# Altium footprint library Cty1.PcbLib: 870 footprints (part 48 of 55)
Each footprint in its own frame and in the unit in brackets; x right, y up, seen from the top. Pads: shape width x height; smd on the part's side, far side on the other; paste and mask are expansions set on the pad; w line width, h text height; cw(c..) or ccw(c..) is an arc to the next point about the centre after c.
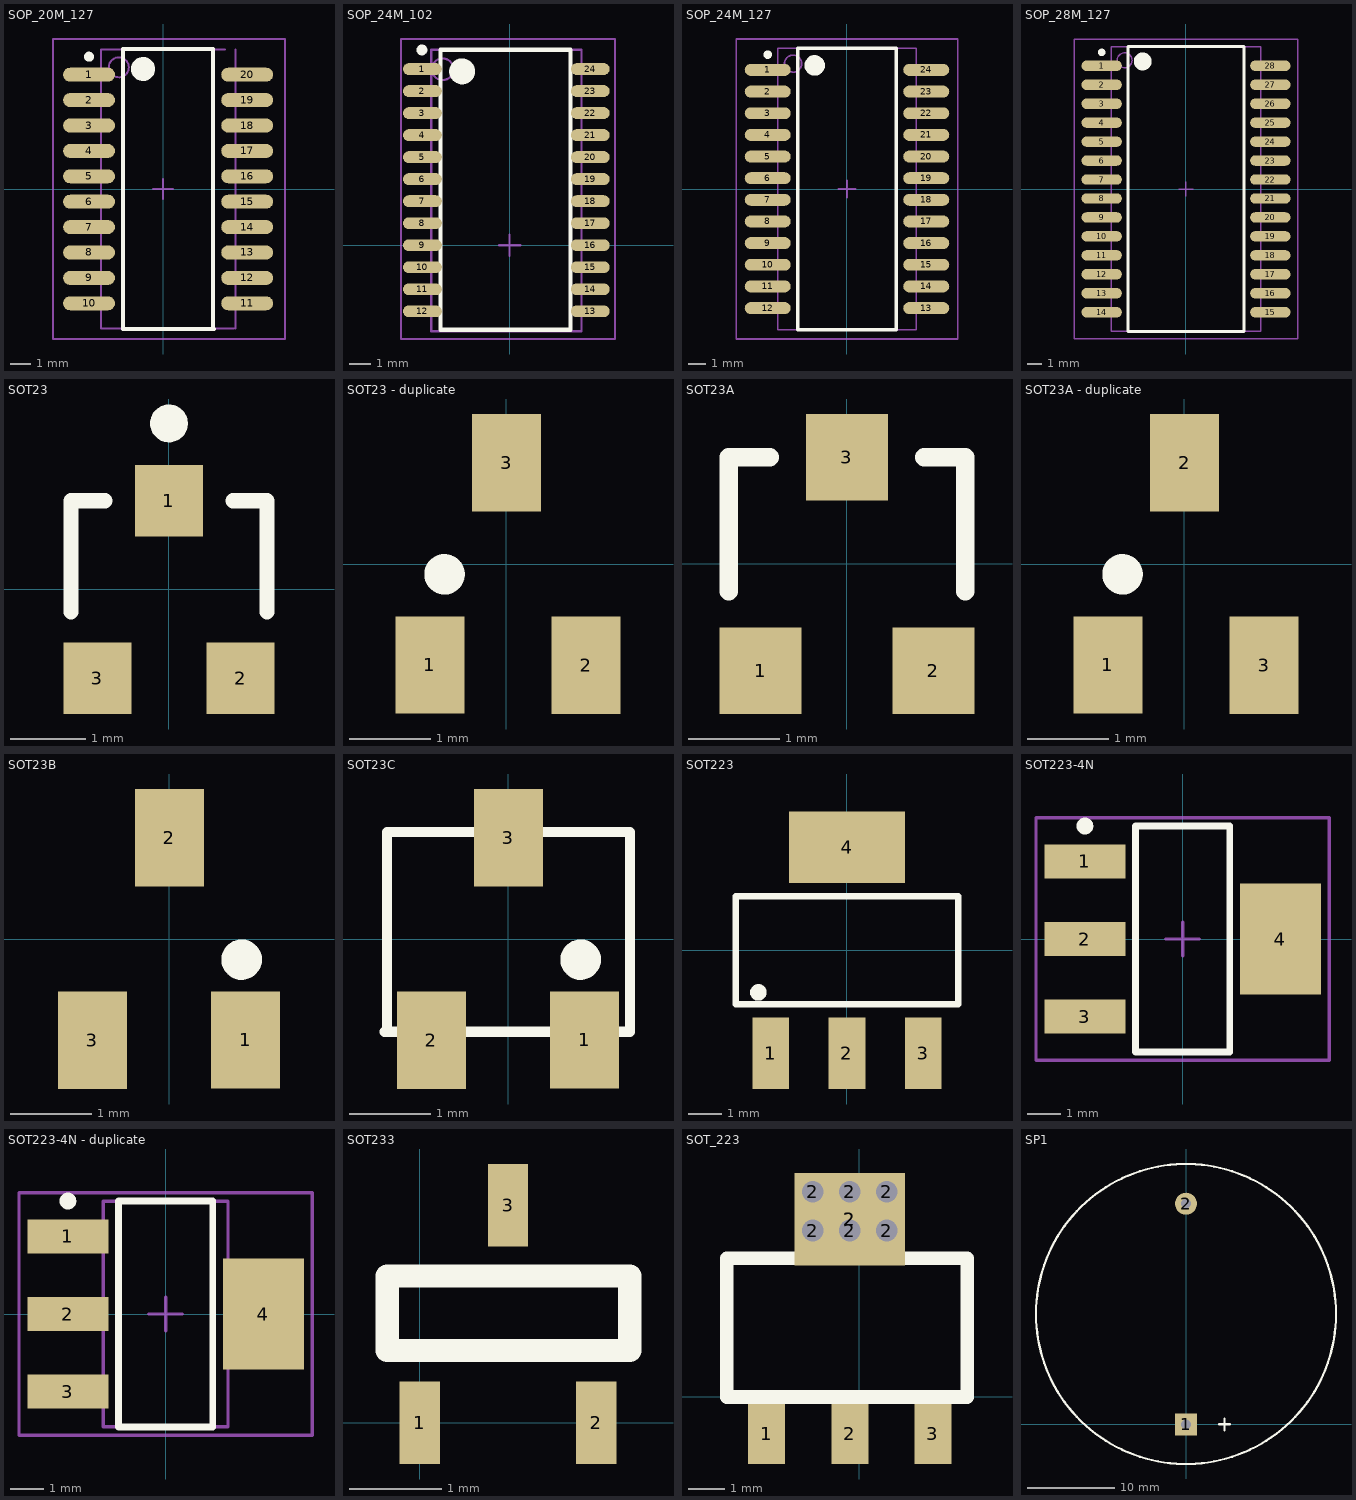
[diagram p47: the footprints below, top view; thin cyan lines are the x and y axes]

## SOP_20M_127 [mm] "SOP, 20-Leads, Body 13.4x6.2mm, Pitch 1.27mm, IPC Low Density"
height 2
pads (20):
  oval 2.6x0.7 smd: 1(-3.7,5.715) 2(-3.7,4.445) 3(-3.7,3.175) 4(-3.7,1.905) 5(-3.7,0.635) 6(-3.7,-0.635) 7(-3.7,-1.905) 8(-3.7,-3.175) 9(-3.7,-4.445) 10(-3.7,-5.715) 11(4.208,-5.715) 12(4.208,-4.445) 13(4.208,-3.175) 14(4.208,-1.905) 15(4.208,-0.635) 16(4.208,0.635) 17(4.208,1.905) 18(4.208,3.175) 19(4.208,4.445) 20(4.208,5.715)
Top Overlay:
  circle w0.6: c-1,6 r0.3
  circle w0.25: c-3.7,6.615 r0.125
  lines w0.2: 2.413,7 -2,7 -2,-7 2.54,-7 ; 2.508,-7 2.508,7
Mechanical 13:
  circle w0.1: c-2.21,6.085 r0.5
  lines w0.1: 3.11,6.985 -3.11,6.985 -3.11,-6.985 3.556,-6.985 ; 3.618,-6.985 3.618,6.985
Mechanical 15:
  lines w0.1: -0.5,0 0.5,0 ; 0,-0.5 0,0.5 ; -5.5,-7.5 6.096,-7.5 6.096,7.5 -5.5,7.5 -5.5,-7.5
3D body: height 2, standoff 0, extent -3.11,-6.985 3.556,6.985

## SOP_24M_102 [mm] "24-Pin Small Outline Package 1.02 mm Pitch"
height 2.64
pads (24):
  oval 1.8x0.55 smd: 1(-4.039,8.16) 2(-4.039,7.14) 3(-4.039,6.12) 4(-4.039,5.1) 5(-4.039,4.08) 6(-4.039,3.06) 7(-4.039,2.04) 8(-4.039,1.02) 9(-4.039,0) 10(-4.039,-1.02) 11(-4.039,-2.04) 12(-4.039,-3.06) 13(3.734,-3.06) 14(3.734,-2.04) 15(3.734,-1.02) 16(3.734,0) 17(3.734,1.02) 18(3.734,2.04) 19(3.734,3.06) 20(3.734,4.08) 21(3.734,5.1) 22(3.734,6.12) 23(3.734,7.14) 24(3.734,8.16)
Top Overlay:
  circle w0.6: c-2.2,8.05 r0.3
  circle w0.25: c-4.062,9.042 r0.125
  lines w0.2: -3.2,-3.912 2.819,-3.912 2.819,9.05 -3.2,9.05 -3.2,-3.912
Mechanical 13:
  circle w0.1: c-3.1,8.15 r0.5
  lines w0.1: -3.632,-3.988 3.327,-3.988 3.327,9.05 -3.632,9.05 -3.632,-3.988
Mechanical 15:
  lines w0.1: -0.5,0 0.5,0 ; 0,-0.5 0,0.5 ; -5.029,-4.343 4.877,-4.343 4.877,9.55 -5.029,9.55 -5.029,-4.343
3D body: height 2.64, standoff 0, extent -3.632,-3.937 3.353,9.05

## SOP_24M_127 [mm] "SOP, 24-Leads, Body 15.6x8.1mm, Pitch 1.27mm, IPC Low Density"
height 2.5
pads (24):
  oval 2.7x0.7 smd: 1(-4.65,6.985) 2(-4.65,5.715) 3(-4.65,4.445) 4(-4.65,3.175) 5(-4.65,1.905) 6(-4.65,0.635) 7(-4.65,-0.635) 8(-4.65,-1.905) 9(-4.65,-3.175) 10(-4.65,-4.445) 11(-4.65,-5.715) 12(-4.65,-6.985) 13(4.65,-6.985) 14(4.65,-5.715) 15(4.65,-4.445) 16(4.65,-3.175) 17(4.65,-1.905) 18(4.65,-0.635) 19(4.65,0.635) 20(4.65,1.905) 21(4.65,3.175) 22(4.65,4.445) 23(4.65,5.715) 24(4.65,6.985)
Top Overlay:
  circle w0.25: c-4.65,7.885 r0.125
  circle w0.6: c-1.9,7.25 r0.3
  lines w0.2: -2.9,-8.25 -2.9,8.25 2.9,8.25 2.9,-8.25 -2.9,-8.25
Mechanical 13:
  circle w0.1: c-3.165,7.355 r0.5
  lines w0.1: -4.065,-8.255 -4.065,8.255 4.065,8.255 4.065,-8.255 -4.065,-8.255
Mechanical 15:
  lines w0.1: -0.5,0 0.5,0 ; 0,-0.5 0,0.5 ; -6.5,-8.8 -6.5,8.8 6.5,8.8 6.5,-8.8 -6.5,-8.8
3D body "SW3dPS-24 pin soic.STEP": height 2.7, standoff -0.11, extent -4.949,-7.853 5.051,7.747
3D body: height 2.79, standoff 0.25, extent -2.649,6.324 -1.785,7.111
3D body: height 2.79, standoff 2.54, extent -0.533,7.188 0.61,7.696

## SOP_28M_127 [mm] "SOP, 28-Leads, Body 18.1x8.6mm, Pitch 1.27mm, IPC Low Density"
height 3.05
pads (28):
  oval 2.7x0.7 smd: 1(-5.65,8.255) 2(-5.65,6.985) 3(-5.65,5.715) 4(-5.65,4.445) 5(-5.65,3.175) 6(-5.65,1.905) 7(-5.65,0.635) 8(-5.65,-0.635) 9(-5.65,-1.905) 10(-5.65,-3.175) 11(-5.65,-4.445) 12(-5.65,-5.715) 13(-5.65,-6.985) 14(-5.65,-8.255) 15(5.65,-8.255) 16(5.65,-6.985) 17(5.65,-5.715) 18(5.65,-4.445) 19(5.65,-3.175) 20(5.65,-1.905) 21(5.65,-0.635) 22(5.65,0.635) 23(5.65,1.905) 24(5.65,3.175) 25(5.65,4.445) 26(5.65,5.715) 27(5.65,6.985) 28(5.65,8.255)
Top Overlay:
  circle w0.6: c-2.9,8.55 r0.3
  circle w0.25: c-5.65,9.155 r0.125
  lines w0.2: -3.9,-9.55 3.9,-9.55 3.9,9.55 -3.9,9.55 -3.9,-9.55
Mechanical 13:
  circle w0.1: c-4.115,8.625 r0.5
  lines w0.1: -5.015,-9.525 5.015,-9.525 5.015,9.525 -5.015,9.525 -5.015,-9.525
Mechanical 15:
  lines w0.1: -0.5,0 0.5,0 ; 0,-0.5 0,0.5 ; -7.5,-10.05 7.5,-10.05 7.5,10.05 -7.5,10.05 -7.5,-10.05
3D body "SO28.STEP": height 2.64, standoff 0, extent -5.336,-9.04 5.334,9.04

## SOT23 [mm] "SOT-23; 3 Leads; Body 3.1 x 2.5 mm, inc. leads (LxW max), Alternate Lead Configuration"
height 1.1
pads (3):
  rect 0.9x0.95 smd: 1(0,1.175) 2(0.95,-1.175) 3(-0.95,-1.175)
Top Overlay:
  circle w0.25: c0,2.2 r0.125
  lines w0.2: -1.3,-0.3 -1.3,1.175 -0.85,1.175 ; 0.85,1.175 1.3,1.175 1.3,-0.3

## SOT23 - duplicate [mm] "SOT 23 _ 1-3-2"
height 1.27
pads (3):
  rect 0.85x1.2 smd: 1(-0.94,-1.245) 2(0.985,-1.25) 3(0.005,1.25)
Top Overlay:
  circle w0.25: c-0.76,-0.127 r0.125
3D body "SW3DPS-SOT-23-DEFAULT.STEP": height 1.06, standoff -0.04, extent -1.475,-1.326 1.525,1.174

## SOT23A [mm] "SOT-23; 3 Leads; Body 3.0 x 2.5 mm, inc. leads (LxW max)"
height 1.2
pads (3):
  rect 0.9x0.95 smd: 1(-0.95,-1.175) 2(0.95,-1.175) 3(0,1.175)
Top Overlay:
  lines w0.2: -1.3,-0.3 -1.3,1.175 -0.85,1.175 ; 0.85,1.175 1.3,1.175 1.3,-0.3

## SOT23A - duplicate [mm] "SOT 23A"
height 1.27
pads (3):
  rect 0.85x1.2 smd: 1(-0.94,-1.245) 2(0.005,1.25) 3(0.985,-1.25)
Top Overlay:
  circle w0.25: c-0.76,-0.127 r0.125
3D body "SW3DPS-SOT-23-DEFAULT.STEP": height 1.06, standoff -0.04, extent -1.5,-1.301 1.5,1.199

## SOT23B [mm] "SOT 23B"
height 1.27
pads (3):
  rect 0.85x1.2 smd: 1(0.94,-1.245) 2(0,1.25) 3(-0.95,-1.25)
Top Overlay:
  circle w0.25: c0.891,-0.254 r0.125
3D body "SW3DPS-SOT-23-DEFAULT.STEP": height 1.06, standoff -0.04, extent -1.5,-1.301 1.5,1.199

## SOT23C [mm] "SOT 23C - 2-3-1 - BCE"
height 1.27
pads (3):
  rect 0.85x1.2 smd: 1(0.94,-1.245) 2(-0.95,-1.25) 3(0,1.25)
Top Overlay:
  circle w0.25: c0.891,-0.254 r0.125
  lines w0.127: -1.524,-1.143 -1.499,-1.143 -1.499,1.321 1.499,1.321 1.499,-1.143 -1.524,-1.143
3D body "SW3DPS-SOT-23-DEFAULT.STEP": height 1.06, standoff -0.04, extent -1.5,-1.174 1.5,1.326

## SOT223 [mm] "SOT-223/SC-73; 4 Leads; Body 6.7 x 7.3 mm, inc. leads (LxW max)"
height 1.8
pads (4):
  rect 1.1x2.15 smd: 1(-2.3,-3.1) 2(0,-3.1) 3(2.3,-3.1)
  rect 3.5x2.15 smd: 4(0,3.1)
Top Overlay:
  circle w0.25: c-2.665,-1.27 r0.125
  lines w0.2: -3.35,-1.625 3.35,-1.625 3.35,1.625 -3.35,1.625 -3.35,-1.625
3D body: height 2.54, standoff 0, extent -3.429,-1.651 3.429,1.651

## SOT223-4N [mm] "SOT223, 4-Leads, Body 6.5x3.5mm, Pitch 2.3mm, Lead Span 7mm, IPC Medium Density"
height 1.8
pads (4):
  rect 2.4x1 smd: 1(-2.9,2.3) 2(-2.9,0) 3(-2.9,-2.3)
  rect 2.4x3.3 smd: 4(2.9,0)
Top Overlay:
  circle w0.25: c-2.9,3.35 r0.125
  lines w0.2: -1.4,-3.35 -1.4,3.35 1.4,3.35 1.4,-3.35 -1.4,-3.35
Mechanical 15:
  lines w0.1: -0.5,0 0.5,0 ; 0,-0.5 0,0.5 ; -4.35,-3.6 -4.35,3.6 4.35,3.6 4.35,-3.6 -4.35,-3.6
3D body "SW3dPS-Regulator.STEP": height 1.72, standoff 0.02, extent -3.395,-3.274 3.496,3.226

## SOT223-4N - duplicate [mm] "SOT223, 4-Leads, Body 6.5x3.5mm, Pitch 2.3mm, Lead Span 7mm, IPC Medium Density"
height 1.8
pads (4):
  rect 2.4x1 smd: 1(-2.9,2.3) 2(-2.9,0) 3(-2.9,-2.3)
  rect 2.4x3.3 smd: 4(2.9,0)
Top Overlay:
  circle w0.25: c-2.9,3.35 r0.125
  lines w0.2: -1.4,-3.35 1.4,-3.35 1.4,3.35 -1.4,3.35 -1.4,-3.35
Mechanical 13:
  lines w0.1: -1.85,-3.35 1.85,-3.35 1.85,3.35 -1.85,3.35 -1.85,-3.35
Mechanical 15:
  lines w0.1: -0.5,0 0.5,0 ; 0,-0.5 0,0.5 ; -4.35,-3.6 4.35,-3.6 4.35,3.6 -4.35,3.6 -4.35,-3.6
3D body: height 1.8, standoff 0, extent -1.85,-3.35 1.85,3.35

## SOT233 [mm]
pads (3):
  rect 0.44x0.9 smd: 1(0,0) 2(1.92,0) 3(0.96,2.37)
Top Overlay:
  lines w0.254: -0.356,0.787 -0.356,1.6 2.286,1.6 2.286,0.787 -0.356,0.787
3D body "User Library-3-lead sot23-3.step": height 1.04, standoff 0.02, extent -0.495,-0.051 2.425,2.425

## SOT_223 [mil]
pads (11):
  rect 40x65 smd: 1(-100,-40) 2(-10,-40) 3(80,-40)
  round 39.37 hole 23.62: 2(-50,180) 2(-50,222) 2(-10,180) 2(-10,222) 2(30,180) 2(30,222)
  rect 120x100 smd: 2(-10,192)
  rect 39.37x78.74 smd far side: 2(-10,192)
Top Overlay:
  lines w15: -143,0 -143,150 117,150 117,0 -143,0

## SP1 [mil] "Speaker Telphone on Broad"
height 3
pads (2):
  rect 100x100 hole 45: 1(0,0)
  round 100 hole 45: 2(0,1000)
Top Overlay:
  circle w10: c0,500 r680
  lines w10: 150,0 200,0 ; 174,-28 174,26
3D body "Sonitron-SCS-32 p10-DEFAULT.STEP": height 382.53, standoff -227.75, extent -666.7,-174.54 652.2,1144.36